# Altium footprint library SMDLibrary.PcbLib: 309 footprints (part 16 of 20)
Each footprint in its own frame and in the unit in brackets; x right, y up, seen from the top. Pads: shape width x height; smd on the part's side, far side on the other; paste and mask are expansions set on the pad; w line width, h text height; cw(c..) or ccw(c..) is an arc to the next point about the centre after c.
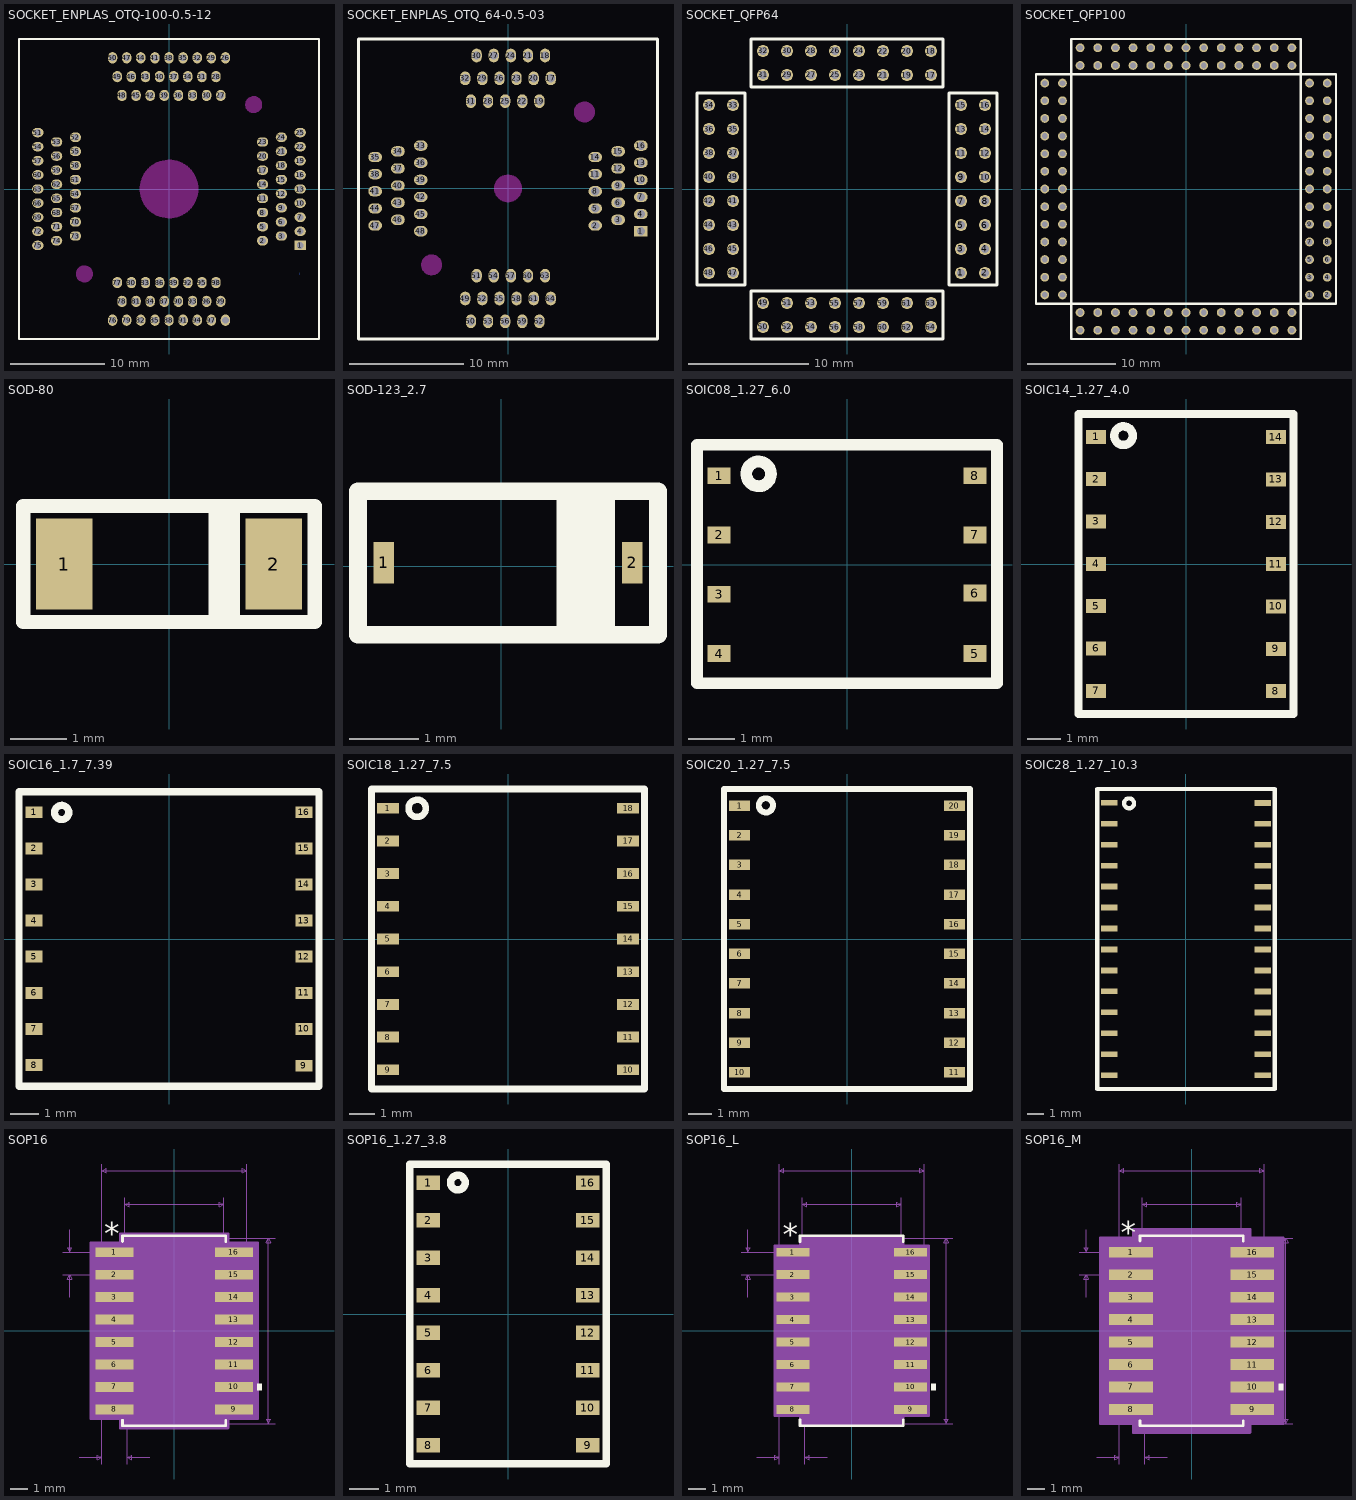
[diagram p15: the footprints below, top view; thin cyan lines are the x and y axes]

## SOCKET_ENPLAS_OTQ-100-0.5-12 [mm]
pads (100):
  rect 1.2x1 hole 0.72: 1(13.95,-6)
  oval 1.2x1 hole 0.72: 2(9.95,-5.5) 3(11.95,-5) 4(13.95,-4.5) 5(9.95,-4) 6(11.95,-3.5) 7(13.95,-3) 8(9.95,-2.5) 9(11.95,-2) 10(13.95,-1.5) 11(9.95,-1) 12(11.95,-0.5) 13(13.95,0) 14(9.95,0.5) 15(11.95,1) 16(13.95,1.5) 17(9.95,2) 18(11.95,2.5) 19(13.95,3) 20(9.95,3.5) 21(11.95,4) 22(13.95,4.5) 23(9.95,5) 24(11.95,5.5) 25(13.95,6) 51(-13.95,6) 52(-9.95,5.5) 53(-11.95,5) 54(-13.95,4.5) 55(-9.95,4) 56(-11.95,3.5) 57(-13.95,3) 58(-9.95,2.5) 59(-11.95,2) 60(-13.95,1.5) 61(-9.95,1) 62(-11.95,0.5) 63(-13.95,0) 64(-9.95,-0.5) 65(-11.95,-1) 66(-13.95,-1.5) 67(-9.95,-2) 68(-11.95,-2.5) 69(-13.95,-3) 70(-9.95,-3.5) 71(-11.95,-4) 72(-13.95,-4.5) 73(-9.95,-5) 74(-11.95,-5.5) 75(-13.95,-6)
  oval 1x1.2 hole 0.72: 26(6,13.95) 27(5.5,9.95) 28(5,11.95) 29(4.5,13.95) 30(4,9.95) 31(3.5,11.95) 32(3,13.95) 33(2.5,9.95) 34(2,11.95) 35(1.5,13.95) 36(1,9.95) 37(0.5,11.95) 38(0,13.95) 39(-0.5,9.95) 40(-1,11.95) 41(-1.5,13.95) 42(-2,9.95) 43(-2.5,11.95) 44(-3,13.95) 45(-3.5,9.95) 46(-4,11.95) 47(-4.5,13.95) 48(-5,9.95) 49(-5.5,11.95) 50(-6,13.95) 76(-6,-13.95) 77(-5.5,-9.95) 78(-5,-11.95) 79(-4.5,-13.95) 80(-4,-9.95) 81(-3.5,-11.95) 82(-3,-13.95) 83(-2.5,-9.95) 84(-2,-11.95) 85(-1.5,-13.95) 86(-1,-9.95) 87(-0.5,-11.95) 88(0,-13.95) 89(0.5,-9.95) 90(1,-11.95) 91(1.5,-13.95) 92(2,-9.95) 93(2.5,-11.95) 94(3,-13.95) 95(3.5,-9.95) 96(4,-11.95) 97(4.5,-13.95) 98(5,-9.95) 99(5.5,-11.95) 100(6,-13.95)
Bottom Layer:
  region: 13.9,-8.889 13.9,-9.139
Top Overlay:
  lines w0.254: -15.95,-15.95 15.95,-15.95 15.95,15.95 -15.95,15.95 -15.95,-15.95
Keep-Out Layer:
  board cut-out: -9,-9.8 -9.079,-9.8 -9.233,-9.769 -9.379,-9.709 -9.51,-9.621 -9.621,-9.51 -9.709,-9.379 -9.769,-9.233 -9.8,-9.079 -9.8,-9 -9.8,-8.921 -9.769,-8.767 -9.709,-8.621 -9.621,-8.49 -9.51,-8.379 -9.379,-8.291 -9.233,-8.231 -9.079,-8.2 -9,-8.2 -8.921,-8.2 -8.767,-8.231 -8.621,-8.291 -8.49,-8.379 -8.379,-8.49 -8.291,-8.621 -8.231,-8.767 -8.2,-8.921 -8.2,-9 -8.2,-9.079 -8.231,-9.233 -8.291,-9.379 -8.379,-9.51 -8.49,-9.621 -8.621,-9.709 -8.767,-9.769 -8.921,-9.8
  board cut-out: 0,-3 -0.197,-3 -0.587,-2.949 -0.966,-2.847 -1.33,-2.696 -1.67,-2.5 -1.982,-2.26 -2.26,-1.982 -2.5,-1.67 -2.696,-1.33 -2.847,-0.966 -2.949,-0.587 -3,-0.197 -3,0 -3,0.197 -2.949,0.587 -2.847,0.966 -2.696,1.33 -2.5,1.67 -2.26,1.982 -1.982,2.26 -1.67,2.5 -1.33,2.696 -0.966,2.847 -0.587,2.949 -0.197,3 0,3 0.197,3 0.587,2.949 0.966,2.847 1.33,2.696 1.67,2.5 1.982,2.26 2.26,1.982 2.5,1.67 2.696,1.33 2.847,0.966 2.949,0.587 3,0.197 3,0 3,-0.197 2.949,-0.587 2.847,-0.966 2.696,-1.33 2.5,-1.67 2.26,-1.982 1.982,-2.26 1.67,-2.5 1.33,-2.696 0.966,-2.847 0.587,-2.949 0.197,-3
  board cut-out: 0.027,-0.163
  board cut-out: 9,8.2 8.921,8.2 8.767,8.231 8.621,8.291 8.49,8.379 8.379,8.49 8.291,8.621 8.231,8.767 8.2,8.921 8.2,9 8.2,9.079 8.231,9.233 8.291,9.379 8.379,9.51 8.49,9.621 8.621,9.709 8.767,9.769 8.921,9.8 9,9.8 9.079,9.8 9.233,9.769 9.379,9.709 9.51,9.621 9.621,9.51 9.709,9.379 9.769,9.233 9.8,9.079 9.8,9 9.8,8.921 9.769,8.767 9.709,8.621 9.621,8.49 9.51,8.379 9.379,8.291 9.233,8.231 9.079,8.2
Keep-Out Layer:
  circle w0.254: c0,0 r3
  circle w0.254: c-9,-9.025 r0.786
  circle w0.254: c9,8.975 r0.786

## SOCKET_ENPLAS_OTQ_64-0.5-03 [mm]
pads (64):
  rect 1.2x0.9 hole 0.72: 1(11.65,-3.75)
  oval 1.2x0.9 hole 0.72: 2(7.65,-3.25) 3(9.65,-2.75) 4(11.65,-2.25) 5(7.65,-1.75) 6(9.65,-1.25) 7(11.65,-0.75) 8(7.65,-0.25) 9(9.65,0.25) 10(11.65,0.75) 11(7.65,1.25) 12(9.65,1.75) 13(11.65,2.25) 14(7.65,2.75) 15(9.65,3.25) 16(11.65,3.75) 33(-7.65,3.75) 34(-9.65,3.25) 35(-11.65,2.75) 36(-7.65,2.25) 37(-9.65,1.75) 38(-11.65,1.25) 39(-7.65,0.75) 40(-9.65,0.25) 41(-11.65,-0.25) 42(-7.65,-0.75) 43(-9.65,-1.25) 44(-11.65,-1.75) 45(-7.65,-2.25) 46(-9.65,-2.75) 47(-11.65,-3.25) 48(-7.65,-3.75)
  oval 0.9x1.2 hole 0.72: 17(3.75,9.65) 18(3.25,11.65) 19(2.75,7.65) 20(2.25,9.65) 21(1.75,11.65) 22(1.25,7.65) 23(0.75,9.65) 24(0.25,11.65) 25(-0.25,7.65) 26(-0.75,9.65) 27(-1.25,11.65) 28(-1.75,7.65) 29(-2.25,9.65) 30(-2.75,11.65) 31(-3.25,7.65) 32(-3.75,9.65) 49(-3.75,-9.65) 50(-3.25,-11.65) 51(-2.75,-7.65) 52(-2.25,-9.65) 53(-1.75,-11.65) 54(-1.25,-7.65) 55(-0.75,-9.65) 56(-0.25,-11.65) 57(0.25,-7.65) 58(0.75,-9.65) 59(1.25,-11.65) 60(1.75,-7.65) 61(2.25,-9.65) 62(2.75,-11.65) 63(3.25,-7.65) 64(3.75,-9.65)
Top Overlay:
  lines w0.254: -13.1,-13.2 -13.1,-11.65 -13.1,13.1 0,13.1 13.1,13.1 13.1,-13.2 -13.1,-13.2
Keep-Out Layer:
  board cut-out: 0,-1.1 -0.108,-1.1 -0.321,-1.058 -0.521,-0.975 -0.701,-0.854 -0.854,-0.701 -0.975,-0.521 -1.058,-0.321 -1.1,-0.108 -1.1,0 -1.1,0.108 -1.058,0.321 -0.975,0.521 -0.854,0.701 -0.701,0.854 -0.521,0.975 -0.321,1.058 -0.108,1.1 0,1.1 0.108,1.1 0.321,1.058 0.521,0.975 0.701,0.854 0.854,0.701 0.975,0.521 1.058,0.321 1.1,0.108 1.1,0 1.1,-0.108 1.058,-0.321 0.975,-0.521 0.854,-0.701 0.701,-0.854 0.521,-0.975 0.321,-1.058 0.108,-1.1
  board cut-out: 6.7,5.9 6.621,5.9 6.467,5.931 6.321,5.991 6.19,6.079 6.079,6.19 5.991,6.321 5.931,6.467 5.9,6.621 5.9,6.7 5.9,6.779 5.931,6.933 5.991,7.079 6.079,7.21 6.19,7.321 6.321,7.409 6.467,7.469 6.621,7.5 6.7,7.5 6.779,7.5 6.933,7.469 7.079,7.409 7.21,7.321 7.321,7.21 7.409,7.079 7.469,6.933 7.5,6.779 7.5,6.7 7.5,6.621 7.469,6.467 7.409,6.321 7.321,6.19 7.21,6.079 7.079,5.991 6.933,5.931 6.779,5.9
  board cut-out: -6.7,-7.5 -6.779,-7.5 -6.933,-7.469 -7.079,-7.409 -7.21,-7.321 -7.321,-7.21 -7.409,-7.079 -7.469,-6.933 -7.5,-6.779 -7.5,-6.7 -7.5,-6.621 -7.469,-6.467 -7.409,-6.321 -7.321,-6.19 -7.21,-6.079 -7.079,-5.991 -6.933,-5.931 -6.779,-5.9 -6.7,-5.9 -6.621,-5.9 -6.467,-5.931 -6.321,-5.991 -6.19,-6.079 -6.079,-6.19 -5.991,-6.321 -5.931,-6.467 -5.9,-6.621 -5.9,-6.7 -5.9,-6.779 -5.931,-6.933 -5.991,-7.079 -6.079,-7.21 -6.19,-7.321 -6.321,-7.409 -6.467,-7.469 -6.621,-7.5
Keep-Out Layer:
  circle w0.254: c-6.7,-6.7 r0.8
  circle w0.254: c6.7,6.7 r0.8
  circle w0.254: c0,0 r1.1

## SOCKET_QFP64 [mm]
pads (64):
  round 1 hole 0.65: 1(9.5,-7) 2(11.5,-7) 3(9.5,-5) 4(11.5,-5) 5(9.5,-3) 6(11.5,-3) 7(9.5,-1) 8(11.5,-1) 9(9.5,1) 10(11.5,1) 11(9.5,3) 12(11.5,3) 13(9.5,5) 14(11.5,5) 15(9.5,7) 16(11.5,7) 17(7,9.5) 18(7,11.5) 19(5,9.5) 20(5,11.5) 21(3,9.5) 22(3,11.5) 23(1,9.5) 24(1,11.5) 25(-1,9.5) 26(-1,11.5) 27(-3,9.5) 28(-3,11.5) 29(-5,9.5) 30(-5,11.5) 31(-7,9.5) 32(-7,11.5) 33(-9.5,7) 34(-11.5,7) 35(-9.5,5) 36(-11.5,5) 37(-9.5,3) 38(-11.5,3) 39(-9.5,1) 40(-11.5,1) 41(-9.5,-1) 42(-11.5,-1) 43(-9.5,-3) 44(-11.5,-3) 45(-9.5,-5) 46(-11.5,-5) 47(-9.5,-7) 48(-11.5,-7) 49(-7,-9.5) 50(-7,-11.5) 51(-5,-9.5) 52(-5,-11.5) 53(-3,-9.5) 54(-3,-11.5) 55(-1,-9.5) 56(-1,-11.5) 57(1,-9.5) 58(1,-11.5) 59(3,-9.5) 60(3,-11.5) 61(5,-9.5) 62(5,-11.5) 63(7,-9.5) 64(7,-11.5)
Top Overlay:
  lines w0.254: -12.5,-8 -8.5,-8 -8.5,8 -12.5,8 -12.5,-8 ; -12.5,-8 -12.5,-8 ; -8,12.5 -8,8.5 8,8.5 8,12.5 -8,12.5 ; -8,12.5 -8,12.5 ; 8,-12.5 8,-8.5 -8,-8.5 -8,-12.5 8,-12.5 ; 8,-12.5 8,-12.5 ; 12.5,8 8.5,8 8.5,-8 12.5,-8 12.5,8 ; 12.5,8 12.5,8
3D body "pin header 1x1 pitch 2mm heigth 5mm.stp": height 6.01, standoff -2.69, extent 10.5,-8 12.5,-6
3D body "pin header 1x1 pitch 2mm heigth 5mm.stp": height 6.01, standoff -2.69, extent 8.5,-8 10.5,-6
3D body "pin header 1x1 pitch 2mm heigth 5mm.stp": height 6.01, standoff -2.69, extent 10.5,-6 12.5,-4
3D body "pin header 1x1 pitch 2mm heigth 5mm.stp": height 6.01, standoff -2.69, extent 8.5,-6 10.5,-4
3D body "pin header 1x1 pitch 2mm heigth 5mm.stp": height 6.01, standoff -2.69, extent 8.5,-4 10.5,-2
3D body "pin header 1x1 pitch 2mm heigth 5mm.stp": height 6.01, standoff -2.69, extent 10.5,-4 12.5,-2
3D body "pin header 1x1 pitch 2mm heigth 5mm.stp": height 6.01, standoff -2.69, extent 10.5,-2 12.5,0
3D body "pin header 1x1 pitch 2mm heigth 5mm.stp": height 6.01, standoff -2.69, extent 10.5,0 12.5,2
3D body "pin header 1x1 pitch 2mm heigth 5mm.stp": height 6.01, standoff -2.69, extent 10.5,2 12.5,4
3D body "pin header 1x1 pitch 2mm heigth 5mm.stp": height 6.01, standoff -2.69, extent 8.5,-2 10.5,0
3D body "pin header 1x1 pitch 2mm heigth 5mm.stp": height 6.01, standoff -2.69, extent 8.5,0 10.5,2
3D body "pin header 1x1 pitch 2mm heigth 5mm.stp": height 6.01, standoff -2.69, extent 8.5,2 10.5,4
3D body "pin header 1x1 pitch 2mm heigth 5mm.stp": height 6.01, standoff -2.69, extent 10.5,4 12.5,6
3D body "pin header 1x1 pitch 2mm heigth 5mm.stp": height 6.01, standoff -2.69, extent 8.5,4 10.5,6
3D body "pin header 1x1 pitch 2mm heigth 5mm.stp": height 6.01, standoff -2.69, extent 10.5,6 12.5,8
3D body "pin header 1x1 pitch 2mm heigth 5mm.stp": height 6.01, standoff -2.69, extent 8.5,6 10.5,8
3D body "pin header 1x1 pitch 2mm heigth 5mm.stp": height 6.01, standoff -2.69, extent -8,-12.5 -6,-10.5
3D body "pin header 1x1 pitch 2mm heigth 5mm.stp": height 6.01, standoff -2.69, extent -8,-10.5 -6,-8.5
3D body "pin header 1x1 pitch 2mm heigth 5mm.stp": height 6.01, standoff -2.69, extent -6,-12.5 -4,-10.5
3D body "pin header 1x1 pitch 2mm heigth 5mm.stp": height 6.01, standoff -2.69, extent -6,-10.5 -4,-8.5
3D body "pin header 1x1 pitch 2mm heigth 5mm.stp": height 6.01, standoff -2.69, extent -4,-10.5 -2,-8.5
3D body "pin header 1x1 pitch 2mm heigth 5mm.stp": height 6.01, standoff -2.69, extent -4,-12.5 -2,-10.5
3D body "pin header 1x1 pitch 2mm heigth 5mm.stp": height 6.01, standoff -2.69, extent -2,-12.5 0,-10.5
3D body "pin header 1x1 pitch 2mm heigth 5mm.stp": height 6.01, standoff -2.69, extent 0,-12.5 2,-10.5
3D body "pin header 1x1 pitch 2mm heigth 5mm.stp": height 6.01, standoff -2.69, extent 2,-12.5 4,-10.5
3D body "pin header 1x1 pitch 2mm heigth 5mm.stp": height 6.01, standoff -2.69, extent -2,-10.5 0,-8.5
3D body "pin header 1x1 pitch 2mm heigth 5mm.stp": height 6.01, standoff -2.69, extent 0,-10.5 2,-8.5
3D body "pin header 1x1 pitch 2mm heigth 5mm.stp": height 6.01, standoff -2.69, extent 2,-10.5 4,-8.5
3D body "pin header 1x1 pitch 2mm heigth 5mm.stp": height 6.01, standoff -2.69, extent 4,-12.5 6,-10.5
3D body "pin header 1x1 pitch 2mm heigth 5mm.stp": height 6.01, standoff -2.69, extent 4,-10.5 6,-8.5
3D body "pin header 1x1 pitch 2mm heigth 5mm.stp": height 6.01, standoff -2.69, extent 6,-12.5 8,-10.5
3D body "pin header 1x1 pitch 2mm heigth 5mm.stp": height 6.01, standoff -2.69, extent 6,-10.5 8,-8.5
3D body "pin header 1x1 pitch 2mm heigth 5mm.stp": height 6.01, standoff -2.69, extent -12.5,6 -10.5,8
3D body "pin header 1x1 pitch 2mm heigth 5mm.stp": height 6.01, standoff -2.69, extent -10.5,6 -8.5,8
3D body "pin header 1x1 pitch 2mm heigth 5mm.stp": height 6.01, standoff -2.69, extent -12.5,4 -10.5,6
3D body "pin header 1x1 pitch 2mm heigth 5mm.stp": height 6.01, standoff -2.69, extent -10.5,4 -8.5,6
3D body "pin header 1x1 pitch 2mm heigth 5mm.stp": height 6.01, standoff -2.69, extent -10.5,2 -8.5,4
3D body "pin header 1x1 pitch 2mm heigth 5mm.stp": height 6.01, standoff -2.69, extent -12.5,2 -10.5,4
3D body "pin header 1x1 pitch 2mm heigth 5mm.stp": height 6.01, standoff -2.69, extent -12.5,0 -10.5,2
3D body "pin header 1x1 pitch 2mm heigth 5mm.stp": height 6.01, standoff -2.69, extent -12.5,-2 -10.5,0
3D body "pin header 1x1 pitch 2mm heigth 5mm.stp": height 6.01, standoff -2.69, extent -12.5,-4 -10.5,-2
3D body "pin header 1x1 pitch 2mm heigth 5mm.stp": height 6.01, standoff -2.69, extent -10.5,0 -8.5,2
3D body "pin header 1x1 pitch 2mm heigth 5mm.stp": height 6.01, standoff -2.69, extent -10.5,-2 -8.5,0
3D body "pin header 1x1 pitch 2mm heigth 5mm.stp": height 6.01, standoff -2.69, extent -10.5,-4 -8.5,-2
3D body "pin header 1x1 pitch 2mm heigth 5mm.stp": height 6.01, standoff -2.69, extent -12.5,-6 -10.5,-4
3D body "pin header 1x1 pitch 2mm heigth 5mm.stp": height 6.01, standoff -2.69, extent -10.5,-6 -8.5,-4
3D body "pin header 1x1 pitch 2mm heigth 5mm.stp": height 6.01, standoff -2.69, extent -12.5,-8 -10.5,-6
3D body "pin header 1x1 pitch 2mm heigth 5mm.stp": height 6.01, standoff -2.69, extent -10.5,-8 -8.5,-6
3D body "pin header 1x1 pitch 2mm heigth 5mm.stp": height 6.01, standoff -2.69, extent 6,10.5 8,12.5
3D body "pin header 1x1 pitch 2mm heigth 5mm.stp": height 6.01, standoff -2.69, extent 6,8.5 8,10.5
3D body "pin header 1x1 pitch 2mm heigth 5mm.stp": height 6.01, standoff -2.69, extent 4,10.5 6,12.5
3D body "pin header 1x1 pitch 2mm heigth 5mm.stp": height 6.01, standoff -2.69, extent 4,8.5 6,10.5
3D body "pin header 1x1 pitch 2mm heigth 5mm.stp": height 6.01, standoff -2.69, extent 2,8.5 4,10.5
3D body "pin header 1x1 pitch 2mm heigth 5mm.stp": height 6.01, standoff -2.69, extent 2,10.5 4,12.5
3D body "pin header 1x1 pitch 2mm heigth 5mm.stp": height 6.01, standoff -2.69, extent 0,10.5 2,12.5
3D body "pin header 1x1 pitch 2mm heigth 5mm.stp": height 6.01, standoff -2.69, extent -2,10.5 0,12.5
3D body "pin header 1x1 pitch 2mm heigth 5mm.stp": height 6.01, standoff -2.69, extent -4,10.5 -2,12.5
3D body "pin header 1x1 pitch 2mm heigth 5mm.stp": height 6.01, standoff -2.69, extent 0,8.5 2,10.5
3D body "pin header 1x1 pitch 2mm heigth 5mm.stp": height 6.01, standoff -2.69, extent -2,8.5 0,10.5
3D body "pin header 1x1 pitch 2mm heigth 5mm.stp": height 6.01, standoff -2.69, extent -4,8.5 -2,10.5
3D body "pin header 1x1 pitch 2mm heigth 5mm.stp": height 6.01, standoff -2.69, extent -6,10.5 -4,12.5
3D body "pin header 1x1 pitch 2mm heigth 5mm.stp": height 6.01, standoff -2.69, extent -6,8.5 -4,10.5
3D body "pin header 1x1 pitch 2mm heigth 5mm.stp": height 6.01, standoff -2.69, extent -8,10.5 -6,12.5
3D body "pin header 1x1 pitch 2mm heigth 5mm.stp": height 6.01, standoff -2.69, extent -8,8.5 -6,10.5

## SOCKET_QFP100 [mm]
pads (104):
  round 1 hole 0.65: 1(14,-12) 2(16,-12) 3(14,-10) 4(16,-10) 5(14,-8) 6(16,-8) 7(14,-6) 8(16,-6) 9(14,-4) 10(16,-4) 11(14,-2) 12(16,-2) 13(14,0) 14(16,0) 15(14,2) 16(16,2) 17(14,4) 18(16,4) 19(14,6) 20(16,6) 21(14,8) 22(16,8) 23(14,10) 24(16,10) 25(14,12) 26(12,14) 27(12,16) 28(10,14) 29(10,16) 30(8,14) 31(8,16) 32(6,14) 33(6,16) 34(4,14) 35(4,16) 36(2,14) 37(2,16) 38(0,14) 39(0,16) 40(-2,14) 41(-2,16) 42(-4,14) 43(-4,16) 44(-6,14) 45(-6,16) 46(-8,14) 47(-8,16) 48(-10,14) 49(-10,16) 50(-12,14) 51(-14,12) 52(-16,12) 53(-14,10) 54(-16,10) 55(-14,8) 56(-16,8) 57(-14,6) 58(-16,6) 59(-14,4) 60(-16,4) 61(-14,2) 62(-16,2) 63(-14,0) 64(-16,0) 65(-14,-2) 66(-16,-2) 67(-14,-4) 68(-16,-4) 69(-14,-6) 70(-16,-6) 71(-14,-8) 72(-16,-8) 73(-14,-10) 74(-16,-10) 75(-14,-12) 76(-12,-14) 77(-12,-16) 78(-10,-14) 79(-10,-16) 80(-8,-14) 81(-8,-16) 82(-6,-14) 83(-6,-16) 84(-4,-14) 85(-4,-16) 86(-2,-14) 87(-2,-16) 88(0,-14) 89(0,-16) 90(2,-14) 91(2,-16) 92(4,-14) 93(4,-16) 94(6,-14) 95(6,-16) 96(8,-14) 97(8,-16) 98(10,-14) 99(10,-16) 100(12,-14) NC(-16,-12) NC(-12,16) NC(12,-16) NC(16,12)
Top Overlay:
  lines w0.254: -2,13 2,13 ; 2,-13 -2,-13 ; -17,-13 -13,-13 ; -17,-13 -17,-13 ; -17,-13 -17,13 -13,13 ; -13,-13 -13,-17 13,-17 ; -13,-13 13,-13 ; -13,-13 -13,-13 ; -13,-13 -13,13 ; -13,13 -13,13 ; -13,13 -13,17 ; -13,13 13,13 ; -13,17 -13,17 ; -13,17 13,17 13,13 ; -2,-13 -2,-13 ; 2,13 2,13 ; 13,-17 13,-13 ; 13,-17 13,-17 ; 13,-13 17,-13 17,13 ; 13,-13 13,13 ; 13,-13 13,-13 ; 13,13 13,13 ; 13,13 17,13 ; 17,13 17,13
3D body "pin header 1x1 pitch 2mm heigth 5mm.stp": height 6.01, standoff -2.69, extent 11,-15 13,-13
3D body "pin header 1x1 pitch 2mm heigth 5mm.stp": height 6.01, standoff -2.69, extent 11,-17 13,-15
3D body "pin header 1x1 pitch 2mm heigth 5mm.stp": height 6.01, standoff -2.69, extent 9,-15 11,-13
3D body "pin header 1x1 pitch 2mm heigth 5mm.stp": height 6.01, standoff -2.69, extent 9,-17 11,-15
3D body "pin header 1x1 pitch 2mm heigth 5mm.stp": height 6.01, standoff -2.69, extent 7,-15 9,-13
3D body "pin header 1x1 pitch 2mm heigth 5mm.stp": height 6.01, standoff -2.69, extent 5,-15 7,-13
3D body "pin header 1x1 pitch 2mm heigth 5mm.stp": height 6.01, standoff -2.69, extent 3,-15 5,-13
3D body "pin header 1x1 pitch 2mm heigth 5mm.stp": height 6.01, standoff -2.69, extent 7,-17 9,-15
3D body "pin header 1x1 pitch 2mm heigth 5mm.stp": height 6.01, standoff -2.69, extent 5,-17 7,-15
3D body "pin header 1x1 pitch 2mm heigth 5mm.stp": height 6.01, standoff -2.69, extent 3,-17 5,-15
3D body "pin header 1x1 pitch 2mm heigth 5mm.stp": height 6.01, standoff -2.69, extent 1,-17 3,-15
3D body "pin header 1x1 pitch 2mm heigth 5mm.stp": height 6.01, standoff -2.69, extent 1,-15 3,-13
3D body "pin header 1x1 pitch 2mm heigth 5mm.stp": height 6.01, standoff -2.69, extent -11,-15 -9,-13
3D body "pin header 1x1 pitch 2mm heigth 5mm.stp": height 6.01, standoff -2.69, extent -11,-17 -9,-15
3D body "pin header 1x1 pitch 2mm heigth 5mm.stp": height 6.01, standoff -2.69, extent -9,-17 -7,-15
3D body "pin header 1x1 pitch 2mm heigth 5mm.stp": height 6.01, standoff -2.69, extent -7,-17 -5,-15
3D body "pin header 1x1 pitch 2mm heigth 5mm.stp": height 6.01, standoff -2.69, extent -5,-17 -3,-15
3D body "pin header 1x1 pitch 2mm heigth 5mm.stp": height 6.01, standoff -2.69, extent -9,-15 -7,-13
3D body "pin header 1x1 pitch 2mm heigth 5mm.stp": height 6.01, standoff -2.69, extent -7,-15 -5,-13
3D body "pin header 1x1 pitch 2mm heigth 5mm.stp": height 6.01, standoff -2.69, extent -5,-15 -3,-13
3D body "pin header 1x1 pitch 2mm heigth 5mm.stp": height 6.01, standoff -2.69, extent -3,-17 -1,-15
3D body "pin header 1x1 pitch 2mm heigth 5mm.stp": height 6.01, standoff -2.69, extent -3,-15 -1,-13
3D body "pin header 1x1 pitch 2mm heigth 5mm.stp": height 6.01, standoff -2.69, extent -1,-17 1,-15
3D body "pin header 1x1 pitch 2mm heigth 5mm.stp": height 6.01, standoff -2.69, extent -1,-15 1,-13
3D body "pin header 1x1 pitch 2mm heigth 5mm.stp": height 6.01, standoff -2.69, extent -13,-17 -11,-15
3D body "pin header 1x1 pitch 2mm heigth 5mm.stp": height 6.01, standoff -2.69, extent -13,-15 -11,-13
3D body "pin header 1x1 pitch 2mm heigth 5mm.stp": height 6.01, standoff -2.69, extent -15,-13 -13,-11
3D body "pin header 1x1 pitch 2mm heigth 5mm.stp": height 6.01, standoff -2.69, extent -17,-13 -15,-11
3D body "pin header 1x1 pitch 2mm heigth 5mm.stp": height 6.01, standoff -2.69, extent -15,-11 -13,-9
3D body "pin header 1x1 pitch 2mm heigth 5mm.stp": height 6.01, standoff -2.69, extent -17,-11 -15,-9
3D body "pin header 1x1 pitch 2mm heigth 5mm.stp": height 6.01, standoff -2.69, extent -15,-9 -13,-7
3D body "pin header 1x1 pitch 2mm heigth 5mm.stp": height 6.01, standoff -2.69, extent -15,-7 -13,-5
3D body "pin header 1x1 pitch 2mm heigth 5mm.stp": height 6.01, standoff -2.69, extent -15,-5 -13,-3
3D body "pin header 1x1 pitch 2mm heigth 5mm.stp": height 6.01, standoff -2.69, extent -17,-9 -15,-7
3D body "pin header 1x1 pitch 2mm heigth 5mm.stp": height 6.01, standoff -2.69, extent -17,-7 -15,-5
3D body "pin header 1x1 pitch 2mm heigth 5mm.stp": height 6.01, standoff -2.69, extent -17,-5 -15,-3
3D body "pin header 1x1 pitch 2mm heigth 5mm.stp": height 6.01, standoff -2.69, extent -17,-3 -15,-1
3D body "pin header 1x1 pitch 2mm heigth 5mm.stp": height 6.01, standoff -2.69, extent -15,-3 -13,-1
3D body "pin header 1x1 pitch 2mm heigth 5mm.stp": height 6.01, standoff -2.69, extent -15,9 -13,11
3D body "pin header 1x1 pitch 2mm heigth 5mm.stp": height 6.01, standoff -2.69, extent -17,9 -15,11
3D body "pin header 1x1 pitch 2mm heigth 5mm.stp": height 6.01, standoff -2.69, extent -17,7 -15,9
3D body "pin header 1x1 pitch 2mm heigth 5mm.stp": height 6.01, standoff -2.69, extent -17,5 -15,7
3D body "pin header 1x1 pitch 2mm heigth 5mm.stp": height 6.01, standoff -2.69, extent -17,3 -15,5
3D body "pin header 1x1 pitch 2mm heigth 5mm.stp": height 6.01, standoff -2.69, extent -15,7 -13,9
3D body "pin header 1x1 pitch 2mm heigth 5mm.stp": height 6.01, standoff -2.69, extent -15,5 -13,7
3D body "pin header 1x1 pitch 2mm heigth 5mm.stp": height 6.01, standoff -2.69, extent -15,3 -13,5
3D body "pin header 1x1 pitch 2mm heigth 5mm.stp": height 6.01, standoff -2.69, extent -17,1 -15,3
3D body "pin header 1x1 pitch 2mm heigth 5mm.stp": height 6.01, standoff -2.69, extent -15,1 -13,3
3D body "pin header 1x1 pitch 2mm heigth 5mm.stp": height 6.01, standoff -2.69, extent -17,-1 -15,1
3D body "pin header 1x1 pitch 2mm heigth 5mm.stp": height 6.01, standoff -2.69, extent -15,-1 -13,1
3D body "pin header 1x1 pitch 2mm heigth 5mm.stp": height 6.01, standoff -2.69, extent -17,11 -15,13
3D body "pin header 1x1 pitch 2mm heigth 5mm.stp": height 6.01, standoff -2.69, extent -15,11 -13,13
3D body "pin header 1x1 pitch 2mm heigth 5mm.stp": height 6.01, standoff -2.69, extent -13,13 -11,15
3D body "pin header 1x1 pitch 2mm heigth 5mm.stp": height 6.01, standoff -2.69, extent -11,13 -9,15
3D body "pin header 1x1 pitch 2mm heigth 5mm.stp": height 6.01, standoff -2.69, extent -9,13 -7,15
3D body "pin header 1x1 pitch 2mm heigth 5mm.stp": height 6.01, standoff -2.69, extent -7,13 -5,15
3D body "pin header 1x1 pitch 2mm heigth 5mm.stp": height 6.01, standoff -2.69, extent -5,13 -3,15
3D body "pin header 1x1 pitch 2mm heigth 5mm.stp": height 6.01, standoff -2.69, extent -3,13 -1,15
3D body "pin header 1x1 pitch 2mm heigth 5mm.stp": height 6.01, standoff -2.69, extent 9,13 11,15
3D body "pin header 1x1 pitch 2mm heigth 5mm.stp": height 6.01, standoff -2.69, extent 7,13 9,15
3D body "pin header 1x1 pitch 2mm heigth 5mm.stp": height 6.01, standoff -2.69, extent 5,13 7,15
3D body "pin header 1x1 pitch 2mm heigth 5mm.stp": height 6.01, standoff -2.69, extent 3,13 5,15
3D body "pin header 1x1 pitch 2mm heigth 5mm.stp": height 6.01, standoff -2.69, extent 1,13 3,15
3D body "pin header 1x1 pitch 2mm heigth 5mm.stp": height 6.01, standoff -2.69, extent -1,13 1,15
3D body "pin header 1x1 pitch 2mm heigth 5mm.stp": height 6.01, standoff -2.69, extent 11,13 13,15
3D body "pin header 1x1 pitch 2mm heigth 5mm.stp": height 6.01, standoff -2.69, extent 13,11 15,13
3D body "pin header 1x1 pitch 2mm heigth 5mm.stp": height 6.01, standoff -2.69, extent 15,11 17,13
3D body "pin header 1x1 pitch 2mm heigth 5mm.stp": height 6.01, standoff -2.69, extent 13,9 15,11
3D body "pin header 1x1 pitch 2mm heigth 5mm.stp": height 6.01, standoff -2.69, extent 15,9 17,11
3D body "pin header 1x1 pitch 2mm heigth 5mm.stp": height 6.01, standoff -2.69, extent 13,7 15,9
3D body "pin header 1x1 pitch 2mm heigth 5mm.stp": height 6.01, standoff -2.69, extent 13,5 15,7
3D body "pin header 1x1 pitch 2mm heigth 5mm.stp": height 6.01, standoff -2.69, extent 13,3 15,5
3D body "pin header 1x1 pitch 2mm heigth 5mm.stp": height 6.01, standoff -2.69, extent 15,7 17,9
3D body "pin header 1x1 pitch 2mm heigth 5mm.stp": height 6.01, standoff -2.69, extent 15,5 17,7
3D body "pin header 1x1 pitch 2mm heigth 5mm.stp": height 6.01, standoff -2.69, extent 15,3 17,5
3D body "pin header 1x1 pitch 2mm heigth 5mm.stp": height 6.01, standoff -2.69, extent 15,1 17,3
3D body "pin header 1x1 pitch 2mm heigth 5mm.stp": height 6.01, standoff -2.69, extent 13,1 15,3
3D body "pin header 1x1 pitch 2mm heigth 5mm.stp": height 6.01, standoff -2.69, extent 13,-11 15,-9
3D body "pin header 1x1 pitch 2mm heigth 5mm.stp": height 6.01, standoff -2.69, extent 15,-11 17,-9
3D body "pin header 1x1 pitch 2mm heigth 5mm.stp": height 6.01, standoff -2.69, extent 15,-9 17,-7
3D body "pin header 1x1 pitch 2mm heigth 5mm.stp": height 6.01, standoff -2.69, extent 15,-7 17,-5
3D body "pin header 1x1 pitch 2mm heigth 5mm.stp": height 6.01, standoff -2.69, extent 15,-5 17,-3
3D body "pin header 1x1 pitch 2mm heigth 5mm.stp": height 6.01, standoff -2.69, extent 13,-9 15,-7
3D body "pin header 1x1 pitch 2mm heigth 5mm.stp": height 6.01, standoff -2.69, extent 13,-7 15,-5
3D body "pin header 1x1 pitch 2mm heigth 5mm.stp": height 6.01, standoff -2.69, extent 13,-5 15,-3
3D body "pin header 1x1 pitch 2mm heigth 5mm.stp": height 6.01, standoff -2.69, extent 15,-3 17,-1
3D body "pin header 1x1 pitch 2mm heigth 5mm.stp": height 6.01, standoff -2.69, extent 13,-3 15,-1
3D body "pin header 1x1 pitch 2mm heigth 5mm.stp": height 6.01, standoff -2.69, extent 15,-1 17,1
3D body "pin header 1x1 pitch 2mm heigth 5mm.stp": height 6.01, standoff -2.69, extent 13,-1 15,1
3D body "pin header 1x1 pitch 2mm heigth 5mm.stp": height 6.01, standoff -2.69, extent 15,-13 17,-11
3D body "pin header 1x1 pitch 2mm heigth 5mm.stp": height 6.01, standoff -2.69, extent 13,-13 15,-11
3D body "pin header 1x1 pitch 2mm heigth 5mm.stp": height 6.01, standoff -2.69, extent -13,15 -11,17
3D body "pin header 1x1 pitch 2mm heigth 5mm.stp": height 6.01, standoff -2.69, extent -11,15 -9,17
3D body "pin header 1x1 pitch 2mm heigth 5mm.stp": height 6.01, standoff -2.69, extent -9,15 -7,17
3D body "pin header 1x1 pitch 2mm heigth 5mm.stp": height 6.01, standoff -2.69, extent -7,15 -5,17
3D body "pin header 1x1 pitch 2mm heigth 5mm.stp": height 6.01, standoff -2.69, extent -5,15 -3,17
3D body "pin header 1x1 pitch 2mm heigth 5mm.stp": height 6.01, standoff -2.69, extent -3,15 -1,17
3D body "pin header 1x1 pitch 2mm heigth 5mm.stp": height 6.01, standoff -2.69, extent 9,15 11,17
3D body "pin header 1x1 pitch 2mm heigth 5mm.stp": height 6.01, standoff -2.69, extent 7,15 9,17
3D body "pin header 1x1 pitch 2mm heigth 5mm.stp": height 6.01, standoff -2.69, extent 5,15 7,17
3D body "pin header 1x1 pitch 2mm heigth 5mm.stp": height 6.01, standoff -2.69, extent 3,15 5,17
3D body "pin header 1x1 pitch 2mm heigth 5mm.stp": height 6.01, standoff -2.69, extent 1,15 3,17
3D body "pin header 1x1 pitch 2mm heigth 5mm.stp": height 6.01, standoff -2.69, extent -1,15 1,17
3D body "pin header 1x1 pitch 2mm heigth 5mm.stp": height 6.01, standoff -2.69, extent 11,15 13,17

## SOD-80 [mm]
pads (2):
  rect 1x1.6 smd: 1(-1.85,0) 2(1.85,0)
Top Overlay:
  rectangle: 0.7,-0.9 1.25,0.925
  lines w0.254: -2.575,-1.025 -2.575,1.025 2.575,1.025 2.575,-1.025 -2.575,-1.025
3D body "User Library-MiniMelf-2.STEP": height 1.6, standoff 0, extent -1.82,-0.8 1.88,0.8

## SOD-123_2.7 [mm]
pads (2):
  rect 0.3x0.6 smd: 1(-1.7,0.05) 2(1.9,0.05)
Top Overlay:
  rectangle: 0.8,-1.025 1.65,1.075
  lines w0.254: -2.075,-0.991 -2.075,1.092 2.275,1.092 2.275,-0.991 -2.075,-0.991
3D body "User Library-SOD123-1.STEP": height 1.18, standoff 0, extent -1.85,-0.85 2.05,0.95

## SOIC08_1.27_6.0 [mm]
pads (8):
  rect 0.5x0.36 smd: 1(-2.75,1.913) 2(-2.75,0.637) 3(-2.75,-0.637) 4(-2.75,-1.913) 5(2.75,-1.913) 6(2.75,-0.613) 7(2.75,0.637) 8(2.75,1.913)
Top Overlay:
  circle w0.254: c-1.9,1.95 r0.266
  lines w0.254: -3.225,-2.553 3.225,-2.553 3.225,2.578 -3.225,2.578 -3.225,-2.553
3D body "User Library-SOIC-8-1.STEP": height 1.75, standoff 0, extent -3,-2.45 3,2.45

## SOIC14_1.27_4.0 [mm]
pads (14):
  rect 0.6x0.42 smd: 1(-2.7,3.815) 2(-2.7,2.545) 3(-2.7,1.275) 4(-2.7,0.005) 5(-2.7,-1.265) 6(-2.7,-2.535) 7(-2.7,-3.805) 8(2.7,-3.815) 9(2.7,-2.545) 10(2.7,-1.275) 11(2.7,-0.005) 12(2.7,1.265) 13(2.7,2.535) 14(2.7,3.805)
Top Overlay:
  circle w0.254: c-1.875,3.85 r0.28
  lines w0.254: -3.225,-4.5 -3.225,4.5 3.225,4.5 3.225,-4.5 -3.225,-4.5
3D body "User Library-SOIC-14.STEP": height 1.75, standoff 0, extent -3,-4.375 3,4.375

## SOIC16_1.7_7.39 [mm]
pads (16):
  rect 0.6x0.42 smd: 1(-4.74,4.457) 2(-4.74,3.187) 3(-4.74,1.917) 4(-4.74,0.647) 5(-4.74,-0.623) 6(-4.74,-1.893) 7(-4.74,-3.163) 8(-4.74,-4.433) 9(4.74,-4.457) 10(4.74,-3.162) 11(4.74,-1.892) 12(4.74,-0.622) 13(4.74,0.648) 14(4.74,1.918) 15(4.74,3.188) 16(4.74,4.458)
Top Overlay:
  circle w0.254: c-3.775,4.45 r0.25
  lines w0.254: -5.275,-5.175 -5.275,5.175 5.275,5.175 5.275,-5.175 -5.275,-5.175
3D body "SOIC16 wide.stp": height 2, standoff 0, extent -5.082,-5.04 5.081,5.04

## SOIC18_1.27_7.5 [mm]
pads (18):
  rect 0.84x0.42 smd: 1(-4.661,5.08) 2(-4.661,3.81) 3(-4.661,2.54) 4(-4.661,1.27) 5(-4.661,0) 6(-4.661,-1.27) 7(-4.661,-2.54) 8(-4.661,-3.81) 9(-4.661,-5.08) 10(4.661,-5.08) 11(4.661,-3.81) 12(4.661,-2.54) 13(4.661,-1.27) 14(4.661,0) 15(4.661,1.27) 16(4.661,2.54) 17(4.661,3.81) 18(4.661,5.08)
Top Overlay:
  circle w0.254: c-3.525,5.075 r0.336
  lines w0.254: -5.3,-5.825 -5.3,5.825 5.3,5.825 5.3,-5.825 -5.3,-5.825
3D body "SOIC18 wide.stp": height 2, standoff 0, extent -5.082,-5.675 5.082,5.675

## SOIC20_1.27_7.5 [mm]
pads (20):
  rect 0.9x0.45 smd: 1(-4.6,5.715) 2(-4.6,4.445) 3(-4.6,3.175) 4(-4.6,1.905) 5(-4.6,0.635) 6(-4.6,-0.635) 7(-4.6,-1.905) 8(-4.6,-3.175) 9(-4.6,-4.445) 10(-4.6,-5.715) 11(4.6,-5.715) 12(4.6,-4.445) 13(4.6,-3.175) 14(4.6,-1.905) 15(4.6,-0.635) 16(4.6,0.635) 17(4.6,1.905) 18(4.6,3.175) 19(4.6,4.445) 20(4.6,5.715)
Top Overlay:
  circle w0.254: c-3.475,5.725 r0.305
  lines w0.254: -5.275,-6.425 5.275,-6.425 5.275,6.425 -5.275,6.425 -5.275,-6.425
3D body "User Library-SOIC20.STEP": height 2.2, standoff -0.04, extent -5.067,-6.3 5.067,6.3

## SOIC28_1.27_10.3 [mm]
pads (28):
  rect 1x0.35 smd: 1(-4.65,8.258) 2(-4.65,6.988) 3(-4.65,5.718) 4(-4.65,4.448) 5(-4.65,3.178) 6(-4.65,1.908) 7(-4.65,0.638) 8(-4.65,-0.632) 9(-4.65,-1.902) 10(-4.65,-3.172) 11(-4.65,-4.442) 12(-4.65,-5.712) 13(-4.65,-6.982) 14(-4.65,-8.252) 15(4.65,-8.257) 16(4.65,-6.987) 17(4.65,-5.717) 18(4.65,-4.447) 19(4.65,-3.177) 20(4.65,-1.907) 21(4.65,-0.637) 22(4.65,0.633) 23(4.65,1.903) 24(4.65,3.173) 25(4.65,4.443) 26(4.65,5.713) 27(4.65,6.983) 28(4.65,8.253)
Top Overlay:
  circle w0.254: c-3.45,8.225 r0.301
  lines w0.254: -5.375,-9.093 5.375,-9.093 5.375,9.094 -5.375,9.094 -5.375,-9.093
3D body "SW3dPS-SOIC28-300.STEP": height 2.65, standoff 0, extent -5.153,-8.953 5.147,8.947

## SOP16 [mil]
pads (16):
  rect 85x22 smd paste+0 mask+0: 1(-133,175) 2(-133,125) 3(-133,75) 4(-133,25) 5(-133,-25) 6(-133,-75) 7(-133,-125) 8(-133,-175) 9(133,-175) 10(133,-125) 11(133,-75) 12(133,-25) 13(133,25) 14(133,75) 15(133,125) 16(133,175)
Top Overlay:
  region: 185.5,-117.5 195.5,-117.5 195.5,-132.5 185.5,-132.5
  lines w6: -115,-199.1 -115,-211.5 115,-211.5 115,-199.1 ; -115,199.1 -115,211.5 115,211.5 115,199.1
  text "*" at -155.5,192 h50
Mechanical 7:
  lines w1: -248,125 -133,125 ; -248,175 -133,175 ; -233,75 -233,125 ; -233,225 -233,175 ; -211.5,-281.5 -161.5,-281.5 ; -161.5,-296.5 -161.5,0 -161.5,371.5 ; -110,0 -110,296.5 ; -104.5,-296.5 -104.5,0 ; -54.5,-281.5 -104.5,-281.5 ; 0,-206.5 225,-206.5 ; 0,206.5 225,206.5 ; 110,0 110,296.5 ; 161.5,0 161.5,371.5 ; -233,125 -228,115 -238,115 -233,125 ; -233,175 -228,185 -238,185 -233,175 ; -161.5,-281.5 -171.5,-286.5 -171.5,-276.5 -161.5,-281.5 ; -161.5,356.5 -151.5,351.5 -151.5,361.5 -161.5,356.5 ; -161.5,356.5 161.5,356.5 ; -110,281.5 -100,276.5 -100,286.5 -110,281.5 ; -110,281.5 110,281.5 ; -104.5,-281.5 -94.5,-286.5 -94.5,-276.5 -104.5,-281.5 ; 110,281.5 100,276.5 100,286.5 110,281.5 ; 161.5,356.5 151.5,351.5 151.5,361.5 161.5,356.5 ; 210,-206.5 215,-196.5 205,-196.5 210,-206.5 ; 210,-206.5 210,206.5 ; 210,206.5 215,196.5 205,196.5 210,206.5
  text "0.041in/1.041mm" at -226.75,-326.5 h25
  text "0.05in/1.27mm" at -415.5,137.5 h25
  text "0.413in/10.49mm" at 230,-12.5 h25
  text "0.323in/8.204mm" at -93.75,376.5 h25
  text "0.22in/5.588mm" at -87.5,301.5 h25
  text "Alt 2 Padstyle: OX90Y60D30P" at -337.5,-706.5 h50
  text "Alt 1 Padstyle: OX60Y90D30P" at -337.5,-646.5 h50
  text "Pin One Padstyle: RX85Y22D0T" at -350,-466.5 h50
  text "Default Padstyle: RX85Y22D0T" at -350,-406.5 h50
Mechanical 13:
  lines w0: -12,206.5 ccw(c0,206.5) 12,206.5
  lines w1: -161.5,-185 -110,-185 -110,-165 -161.5,-165 -161.5,-185 ; -161.5,-135 -110,-135 -110,-115 -161.5,-115 -161.5,-135 ; -161.5,-85 -110,-85 -110,-65 -161.5,-65 -161.5,-85 ; -161.5,-35 -110,-35 -110,-15 -161.5,-15 -161.5,-35 ; -161.5,15 -110,15 -110,35 -161.5,35 -161.5,15 ; -161.5,65 -110,65 -110,85 -161.5,85 -161.5,65 ; -161.5,115 -110,115 -110,135 -161.5,135 -161.5,115 ; -161.5,165 -110,165 -110,185 -161.5,185 -161.5,165 ; -110,-206.5 -110,206.5 110,206.5 110,-206.5 -110,-206.5 ; 110,-185 161.5,-185 161.5,-165 110,-165 110,-185 ; 110,-135 161.5,-135 161.5,-115 110,-115 110,-135 ; 110,-85 161.5,-85 161.5,-65 110,-65 110,-85 ; 110,-35 161.5,-35 161.5,-15 110,-15 110,-35 ; 110,15 161.5,15 161.5,35 110,35 110,15 ; 110,65 161.5,65 161.5,85 110,85 110,65 ; 110,115 161.5,115 161.5,135 110,135 110,115 ; 110,165 161.5,165 161.5,185 110,185 110,165
  text "*" at -107.5,153.5 h50
Mechanical 15:
  region: -120,-196 -185.5,-196 -185.5,196 -120,196 -120,216.5 120,216.5 120,196 185.5,196 185.5,-196 120,-196 120,-216.5 -120,-216.5
  lines w6: -185.5,-196 -120,-196 -120,-216.5 120,-216.5 120,-196 185.5,-196 185.5,196 120,196 120,216.5 -120,216.5 -120,196 -185.5,196 -185.5,-196
3D body: height 10, standoff 0, extent 0,0 10,10
3D body "NS16.step": height 79.09, standoff 0, extent -161.49,-206.49 161.51,206.5

## SOP16_1.27_3.8 [mm]
pads (16):
  rect 0.8x0.5 smd: 1(-2.7,4.445) 2(-2.7,3.175) 3(-2.7,1.905) 4(-2.7,0.635) 5(-2.7,-0.635) 6(-2.7,-1.905) 7(-2.7,-3.175) 8(-2.7,-4.445) 9(2.7,-4.445) 10(2.7,-3.175) 11(2.7,-1.905) 12(2.7,-0.635) 13(2.7,0.635) 14(2.7,1.905) 15(2.7,3.175) 16(2.7,4.445)
Top Overlay:
  circle w0.254: c-1.7,4.45 r0.247
  lines w0.254: -3.325,-5.08 -3.325,5.08 3.325,5.08 3.325,-5.08 -3.325,-5.08
3D body "User Library-SOP16.STEP": height 1.59, standoff 0, extent -3.117,-4.991 3.117,4.99

## SOP16_L [mil]
pads (16):
  rect 73x20 smd paste+0 mask+0: 1(-131,175) 2(-131,125) 3(-131,75) 4(-131,25) 5(-131,-25) 6(-131,-75) 7(-131,-125) 8(-131,-175) 9(131,-175) 10(131,-125) 11(131,-75) 12(131,-25) 13(131,25) 14(131,75) 15(131,125) 16(131,175)
Top Overlay:
  region: 177.5,-117.5 187.5,-117.5 187.5,-132.5 177.5,-132.5
  lines w6: -115,-198.1 -115,-211.5 115,-211.5 115,-198.1 ; -115,198.1 -115,211.5 115,211.5 115,198.1
  text "*" at -153.5,190 h50
Mechanical 7:
  lines w1: -246,125 -131,125 ; -246,175 -131,175 ; -231,75 -231,125 ; -231,225 -231,175 ; -211.5,-281.5 -161.5,-281.5 ; -161.5,-296.5 -161.5,0 -161.5,371.5 ; -110,0 -110,296.5 ; -104.5,-296.5 -104.5,0 ; -54.5,-281.5 -104.5,-281.5 ; 0,-206.5 225,-206.5 ; 0,206.5 225,206.5 ; 110,0 110,296.5 ; 161.5,0 161.5,371.5 ; -231,125 -236,115 -226,115 -231,125 ; -231,175 -236,185 -226,185 -231,175 ; -161.5,-281.5 -171.5,-276.5 -171.5,-286.5 -161.5,-281.5 ; -161.5,356.5 161.5,356.5 ; -161.5,356.5 -151.5,361.5 -151.5,351.5 -161.5,356.5 ; -110,281.5 110,281.5 ; -110,281.5 -100,286.5 -100,276.5 -110,281.5 ; -104.5,-281.5 -94.5,-276.5 -94.5,-286.5 -104.5,-281.5 ; 110,281.5 100,286.5 100,276.5 110,281.5 ; 161.5,356.5 151.5,361.5 151.5,351.5 161.5,356.5 ; 210,-206.5 210,206.5 ; 210,-206.5 205,-196.5 215,-196.5 210,-206.5 ; 210,206.5 205,196.5 215,196.5 210,206.5
  text "Default Padstyle: RX73Y20D0T" at -350,-406.5 h50
  text "Pin One Padstyle: RX73Y20D0T" at -350,-466.5 h50
  text "Alt 1 Padstyle: OX60Y90D30P" at -337.5,-646.5 h50
  text "Alt 2 Padstyle: OX90Y60D30P" at -337.5,-706.5 h50
  text "0.22in/5.588mm" at -87.5,301.5 h25
  text "0.323in/8.204mm" at -93.75,376.5 h25
  text "0.413in/10.49mm" at 230,-12.5 h25
  text "0.05in/1.27mm" at -413.5,137.5 h25
  text "0.041in/1.041mm" at -226.75,-326.5 h25
Mechanical 13:
  lines w0: -12,206.5 ccw(c0,206.5) 12,206.5
  lines w1: -161.5,-185 -161.5,-165 -110,-165 -110,-185 -161.5,-185 ; -161.5,-135 -161.5,-115 -110,-115 -110,-135 -161.5,-135 ; -161.5,-85 -161.5,-65 -110,-65 -110,-85 -161.5,-85 ; -161.5,-35 -161.5,-15 -110,-15 -110,-35 -161.5,-35 ; -161.5,15 -161.5,35 -110,35 -110,15 -161.5,15 ; -161.5,65 -161.5,85 -110,85 -110,65 -161.5,65 ; -161.5,115 -161.5,135 -110,135 -110,115 -161.5,115 ; -161.5,165 -161.5,185 -110,185 -110,165 -161.5,165 ; -110,-206.5 110,-206.5 110,206.5 -110,206.5 -110,-206.5 ; 110,-185 110,-165 161.5,-165 161.5,-185 110,-185 ; 110,-135 110,-115 161.5,-115 161.5,-135 110,-135 ; 110,-85 110,-65 161.5,-65 161.5,-85 110,-85 ; 110,-35 110,-15 161.5,-15 161.5,-35 110,-35 ; 110,15 110,35 161.5,35 161.5,15 110,15 ; 110,65 110,85 161.5,85 161.5,65 110,65 ; 110,115 110,135 161.5,135 161.5,115 110,115 ; 110,165 110,185 161.5,185 161.5,165 110,165
  text "*" at -107.5,153.5 h50
Mechanical 15:
  region: -114,-189 -171.5,-189 -171.5,189 -114,189 -114,210.5 114,210.5 114,189 171.5,189 171.5,-189 114,-189 114,-210.5 -114,-210.5
  lines w6: -171.5,-189 -171.5,189 -114,189 -114,210.5 114,210.5 114,189 171.5,189 171.5,-189 114,-189 114,-210.5 -114,-210.5 -114,-189 -171.5,-189
3D body: height 10, standoff 0, extent 0,0 10,10
3D body "NS16-L.step": height 79.09, standoff 0, extent -161.49,-206.49 161.51,206.5

## SOP16_M [mil]
pads (16):
  rect 97x24 smd paste+0 mask+0: 1(-135,175) 2(-135,125) 3(-135,75) 4(-135,25) 5(-135,-25) 6(-135,-75) 7(-135,-125) 8(-135,-175) 9(135,-175) 10(135,-125) 11(135,-75) 12(135,-25) 13(135,25) 14(135,75) 15(135,125) 16(135,175)
Top Overlay:
  region: 193.5,-117.5 203.5,-117.5 203.5,-132.5 193.5,-132.5
  lines w6: -115,-200.1 -115,-211.5 115,-211.5 115,-200.1 ; -115,200.1 -115,211.5 115,211.5 115,200.1
  text "*" at -157.5,194 h50
Mechanical 7:
  lines w1: -250,125 -135,125 ; -250,175 -135,175 ; -235,75 -235,125 ; -235,225 -235,175 ; -211.5,-281.5 -161.5,-281.5 ; -161.5,-296.5 -161.5,0 -161.5,371.5 ; -110,0 -110,296.5 ; -104.5,-296.5 -104.5,0 ; -54.5,-281.5 -104.5,-281.5 ; 0,-206.5 225,-206.5 ; 0,206.5 225,206.5 ; 110,0 110,296.5 ; 161.5,0 161.5,371.5 ; -235,125 -240,115 -230,115 -235,125 ; -235,175 -240,185 -230,185 -235,175 ; -161.5,-281.5 -171.5,-276.5 -171.5,-286.5 -161.5,-281.5 ; -161.5,356.5 161.5,356.5 ; -161.5,356.5 -151.5,361.5 -151.5,351.5 -161.5,356.5 ; -110,281.5 110,281.5 ; -110,281.5 -100,286.5 -100,276.5 -110,281.5 ; -104.5,-281.5 -94.5,-276.5 -94.5,-286.5 -104.5,-281.5 ; 110,281.5 100,286.5 100,276.5 110,281.5 ; 161.5,356.5 151.5,361.5 151.5,351.5 161.5,356.5 ; 210,-206.5 210,206.5 ; 210,-206.5 205,-196.5 215,-196.5 210,-206.5 ; 210,206.5 205,196.5 215,196.5 210,206.5
  text "Default Padstyle: RX97Y24D0T" at -350,-406.5 h50
  text "Pin One Padstyle: RX97Y24D0T" at -350,-466.5 h50
  text "Alt 1 Padstyle: OX60Y90D30P" at -337.5,-646.5 h50
  text "Alt 2 Padstyle: OX90Y60D30P" at -337.5,-706.5 h50
  text "0.22in/5.588mm" at -87.5,301.5 h25
  text "0.323in/8.204mm" at -93.75,376.5 h25
  text "0.413in/10.49mm" at 230,-12.5 h25
  text "0.05in/1.27mm" at -417.5,137.5 h25
  text "0.041in/1.041mm" at -226.75,-326.5 h25
Mechanical 13:
  lines w0: -12,206.5 ccw(c0,206.5) 12,206.5
  lines w1: -161.5,-185 -161.5,-165 -110,-165 -110,-185 -161.5,-185 ; -161.5,-135 -161.5,-115 -110,-115 -110,-135 -161.5,-135 ; -161.5,-85 -161.5,-65 -110,-65 -110,-85 -161.5,-85 ; -161.5,-35 -161.5,-15 -110,-15 -110,-35 -161.5,-35 ; -161.5,15 -161.5,35 -110,35 -110,15 -161.5,15 ; -161.5,65 -161.5,85 -110,85 -110,65 -161.5,65 ; -161.5,115 -161.5,135 -110,135 -110,115 -161.5,115 ; -161.5,165 -161.5,185 -110,185 -110,165 -161.5,165 ; -110,-206.5 110,-206.5 110,206.5 -110,206.5 -110,-206.5 ; 110,-185 110,-165 161.5,-165 161.5,-185 110,-185 ; 110,-135 110,-115 161.5,-115 161.5,-135 110,-135 ; 110,-85 110,-65 161.5,-65 161.5,-85 110,-85 ; 110,-35 110,-15 161.5,-15 161.5,-35 110,-35 ; 110,15 110,35 161.5,35 161.5,15 110,15 ; 110,65 110,85 161.5,85 161.5,65 110,65 ; 110,115 110,135 161.5,135 161.5,115 110,115 ; 110,165 110,185 161.5,185 161.5,165 110,165
  text "*" at -107.5,153.5 h50
Mechanical 15:
  region: -130,-207 -203.5,-207 -203.5,207 -130,207 -130,226.5 130,226.5 130,207 203.5,207 203.5,-207 130,-207 130,-226.5 -130,-226.5
  lines w6: -203.5,-207 -203.5,207 -130,207 -130,226.5 130,226.5 130,207 203.5,207 203.5,-207 130,-207 130,-226.5 -130,-226.5 -130,-207 -203.5,-207
3D body "NS16-M.step": height 79.09, standoff 0, extent -161.49,-206.49 161.51,206.51
3D body: height 10, standoff 0, extent 0,0 10,10